# Altium footprint library ADNB95C.PcbLib: 249 footprints (part 11 of 16)
Each footprint in its own frame and in the unit in brackets; x right, y up, seen from the top. Pads: shape width x height; smd on the part's side, far side on the other; paste and mask are expansions set on the pad; w line width, h text height; cw(c..) or ccw(c..) is an arc to the next point about the centre after c.
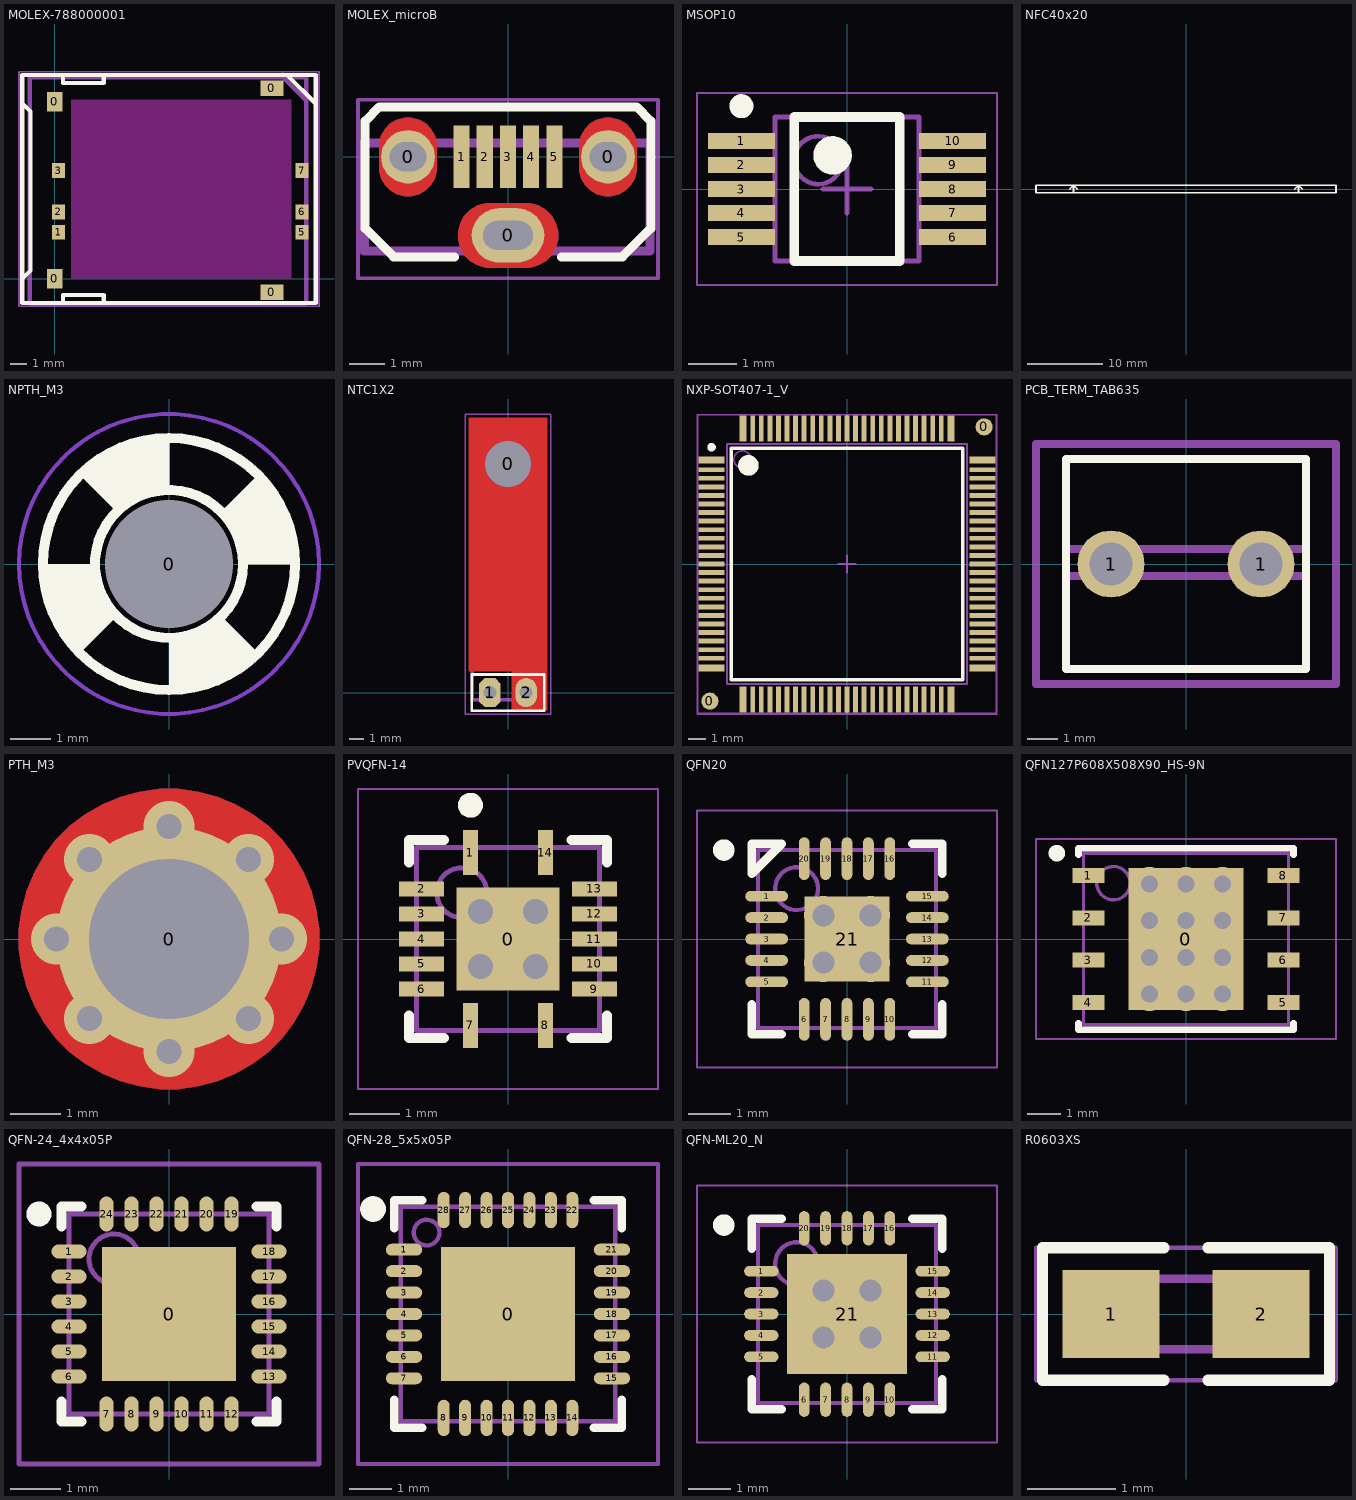
[diagram p10: the footprints below, top view; thin cyan lines are the x and y axes]

## MOLEX-788000001 [mm]
pads (10):
  rect 0.95x1.2 smd: 0(0,0) 0(0,10.85)
  rect 1.4x0.95 smd: 0(13.31,-0.84) 0(13.31,11.68)
  rect 0.8x0.9 smd: 1(0.23,2.85) 2(0.23,4.09) 3(0.23,6.63) 5(15.17,2.85) 6(15.17,4.09) 7(15.17,6.63)
Top Layer keep-out:
  rectangle: 1,0 14.5,11
Top Overlay:
  lines w0.254: -2,0 -1.5,0.5 -1.5,10.25 -2,10.75 ; 0.5,-1.5 0.5,-1 3,-1 3,-1.5 ; 0.5,12.5 0.5,12 3,12 3,12.5 ; 14.25,12.5 16,10.75 ; -2,-1.5 -2,12.5 16,12.5 16,-1.5 -2,-1.5
Top Designator (Mech7):
  text ".Designator" at -0.118,4.992 h1.52
Top Assembly:
  lines w0.254: 14,12.345 15.42,10.925 ; -1.54,-1.505 -1.54,12.345 15.42,12.345 15.42,-1.505 -1.54,-1.505
Top Courtyard:
  lines w0.1: 13.9,12.7 16.2,10.4 ; -2.2,-1.7 16.2,-1.7 16.2,12.7 -2.2,12.7 -2.2,-1.7 ; 16.2,11 16.2,11
3D body "788000001.stp": height 1.51, standoff 0.01, extent -1.54,-1.505 15.42,12.345

## MOLEX_microB [mm] "Molex microB USB P/N: 1051330001"
height 7
pads (8):
  round 1.5 hole 0.813 slot 1.016 at 0 deg: 0(-2.8,0) 0(2.8,0)
  oval 2.032x1.524 hole 0.813 slot 1.4 at 0 deg: 0(0,-2.2)
  rect 0.45x1.75 smd mask+0.076: 1(-1.3,0) 2(-0.65,0) 3(0,0) 4(0.65,0) 5(1.3,0)
Top Layer:
  region: 2,-0.3 2,-0.405 2.055,-0.609 2.16,-0.791 2.309,-0.94 2.491,-1.045 2.695,-1.1 2.905,-1.1 3.109,-1.045 3.291,-0.94 3.44,-0.791 3.545,-0.609 3.6,-0.405 3.6,-0.3 3.6,0.3 3.6,0.405 3.545,0.609 3.44,0.791 3.291,0.94 3.109,1.045 2.905,1.1 2.695,1.1 2.491,1.045 2.309,0.94 2.16,0.791 2.055,0.609 2,0.405 2,0.3
  region: -0.5,-3.1 -0.618,-3.1 -0.847,-3.039 -1.053,-2.92 -1.22,-2.753 -1.339,-2.547 -1.4,-2.318 -1.4,-2.082 -1.339,-1.853 -1.22,-1.647 -1.053,-1.48 -0.847,-1.361 -0.618,-1.3 -0.5,-1.3 0.5,-1.3 0.618,-1.3 0.847,-1.361 1.053,-1.48 1.22,-1.647 1.339,-1.853 1.4,-2.082 1.4,-2.318 1.339,-2.547 1.22,-2.753 1.053,-2.92 0.847,-3.039 0.618,-3.1 0.5,-3.1
  region: -3.6,-0.3 -3.6,-0.405 -3.545,-0.609 -3.44,-0.791 -3.291,-0.94 -3.109,-1.045 -2.905,-1.1 -2.695,-1.1 -2.491,-1.045 -2.309,-0.94 -2.16,-0.791 -2.055,-0.609 -2,-0.405 -2,-0.3 -2,0.3 -2,0.405 -2.055,0.609 -2.16,0.791 -2.309,0.94 -2.491,1.045 -2.695,1.1 -2.905,1.1 -3.109,1.045 -3.291,0.94 -3.44,0.791 -3.545,0.609 -3.6,0.405 -3.6,0.3
Bottom Layer:
  region: 3.6,-0.3 3.6,-0.405 3.545,-0.609 3.44,-0.791 3.291,-0.94 3.109,-1.045 2.905,-1.1 2.695,-1.1 2.491,-1.045 2.309,-0.94 2.16,-0.791 2.055,-0.609 2,-0.405 2,-0.3 2,0.3 2,0.405 2.055,0.609 2.16,0.791 2.309,0.94 2.491,1.045 2.695,1.1 2.905,1.1 3.109,1.045 3.291,0.94 3.44,0.791 3.545,0.609 3.6,0.405 3.6,0.3
  region: 0.5,-3.1 0.618,-3.1 0.847,-3.039 1.053,-2.92 1.22,-2.753 1.339,-2.547 1.4,-2.318 1.4,-2.082 1.339,-1.853 1.22,-1.647 1.053,-1.48 0.847,-1.361 0.618,-1.3 0.5,-1.3 -0.5,-1.3 -0.618,-1.3 -0.847,-1.361 -1.053,-1.48 -1.22,-1.647 -1.339,-1.853 -1.4,-2.082 -1.4,-2.318 -1.339,-2.547 -1.22,-2.753 -1.053,-2.92 -0.847,-3.039 -0.618,-3.1 -0.5,-3.1
  region: -2,-0.3 -2,-0.405 -2.055,-0.609 -2.16,-0.791 -2.309,-0.94 -2.491,-1.045 -2.695,-1.1 -2.905,-1.1 -3.109,-1.045 -3.291,-0.94 -3.44,-0.791 -3.545,-0.609 -3.6,-0.405 -3.6,-0.3 -3.6,0.3 -3.6,0.405 -3.545,0.609 -3.44,0.791 -3.291,0.94 -3.109,1.045 -2.905,1.1 -2.695,1.1 -2.491,1.045 -2.309,0.94 -2.16,0.791 -2.055,0.609 -2,0.405 -2,0.3
Top Overlay:
  lines w0.254: -1.5,-2.8 -3.2,-2.8 -4,-2 -4,1 -3.6,1.4 3.6,1.4 4,1 4,-2 3.2,-2.8 1.5,-2.8
Top Designator (Mech7):
  text ".Designator" at -7.618,-1.508 h1.52
Top Assembly:
  lines w0.254: -4.025,-2.632 3.975,-2.632 3.975,0.383 -4.025,0.383 -4.025,-2.632
Top Courtyard:
  lines w0.1: -4.2,-3.4 4.2,-3.4 4.2,1.6 -4.2,1.6 -4.2,-3.4
3D body "User Library-Micro USB B 1051330011.SLDPRT": height 6.69, standoff -2.32, extent -4.025,-2.632 3.975,0.383

## MSOP10 [mm] "TSSOP, 10-Leads, Body 3.00x3.00mm, Pitch 0.50mm, IPC Medium Density"
height 1.1
pads (10):
  rect 1.4x0.33 smd: 1(-2.2,1) 2(-2.2,0.5) 3(-2.2,0) 4(-2.2,-0.5) 5(-2.2,-1) 6(2.2,-1) 7(2.2,-0.5) 8(2.2,0) 9(2.2,0.5) 10(2.2,1)
Top Overlay:
  circle w0.4: c-0.3,0.7 r0.2
  circle w0.25: c-2.2,1.725 r0.125
  lines w0.2: -1.1,-1.5 1.1,-1.5 1.1,1.5 -1.1,1.5 -1.1,-1.5
Top Designator (Mech7):
  text ".Designator" at -7.618,-0.408 h1.52
Top Assembly:
  circle w0.1: c-0.6,0.6 r0.5
  lines w0.1: -1.5,-1.5 1.5,-1.5 1.5,1.5 -1.5,1.5 -1.5,-1.5
Top Courtyard:
  lines w0.05: -3.125,-2 3.125,-2 3.125,2 -3.125,2 -3.125,-2
  lines w0.1: -0.5,0 0.5,0 ; 0,-0.5 0,0.5
3D body "MSOP10.step": height 1.1, standoff 0, extent -2.45,-1.5 2.45,1.5

## NFC40x20 [mm] "NFC PCB size 40mmx20mmx0.8mm"
height 21
Top Overlay:
  lines w0.203: -15.5,0 -15,0.5 ; -15,-0.5 -15,0.5 ; -14.5,0 -15,0.5 ; 14.5,0 15,0.5 ; 15,-0.5 15,0.5 ; 15.5,0 15,0.5 ; -20,-0.5 -20,0.5 20,0.5 20,-0.5 -20,-0.5
Top Designator (Mech7):
  text ".Designator" at -7.618,-0.508 h1.52
3D body "NFC40x20.SLDPRT": height 21.01, standoff 0.01, extent -20,-0.435 20,0.435

## NPTH_M3 [mm] "Mounting Hole M3  hole 3.2mm Dia 6 mm"
pads (1):
  round 3.1 hole 3.2 unplated: 0(0,0)
Top Layer keep-out:
  circle w0.1: c0,0 r3.75
Bottom Layer keep-out:
  circle w0.1: c0,0 r3.75
Top Overlay:
  circle w0.254: c0,0 r3.15
  circle w0.254: c0,0 r1.85
  region: 1.75,0 1.742,0.172 1.675,0.508 1.543,0.825 1.353,1.11 1.237,1.237 2.298,2.298 2.411,2.185 2.614,1.938 2.791,1.673 2.942,1.391 3.064,1.096 3.156,0.791 3.219,0.477 3.25,0.16 3.25,0
  region: 0,1.75 -0.172,1.742 -0.508,1.675 -0.825,1.543 -1.11,1.353 -1.237,1.237 -2.298,2.298 -2.185,2.411 -1.938,2.614 -1.673,2.791 -1.391,2.942 -1.096,3.064 -0.791,3.156 -0.477,3.219 -0.16,3.25 0,3.25
  region: -1.75,0 -1.742,-0.172 -1.675,-0.508 -1.543,-0.825 -1.353,-1.11 -1.237,-1.237 -2.298,-2.298 -2.411,-2.185 -2.614,-1.938 -2.791,-1.673 -2.942,-1.391 -3.064,-1.096 -3.156,-0.791 -3.219,-0.477 -3.25,-0.16 -3.25,0
  region: 0,-1.75 0.172,-1.742 0.508,-1.675 0.825,-1.543 1.11,-1.353 1.237,-1.237 2.298,-2.298 2.185,-2.411 1.938,-2.614 1.673,-2.791 1.391,-2.942 1.096,-3.064 0.791,-3.156 0.477,-3.219 0.16,-3.25 0,-3.25
Bottom Overlay:
  circle w0.254: c0,0 r3.15
  circle w0.254: c0,0 r1.85
  region: -1.75,0 -1.742,0.172 -1.675,0.508 -1.543,0.825 -1.353,1.11 -1.237,1.237 -2.298,2.298 -2.411,2.185 -2.614,1.938 -2.791,1.673 -2.942,1.391 -3.064,1.096 -3.156,0.791 -3.219,0.477 -3.25,0.16 -3.25,0
  region: 0,1.75 0.172,1.742 0.508,1.675 0.825,1.543 1.11,1.353 1.237,1.237 2.298,2.298 2.185,2.411 1.938,2.614 1.673,2.791 1.391,2.942 1.096,3.064 0.791,3.156 0.477,3.219 0.16,3.25 0,3.25
  region: 1.75,0 1.742,-0.172 1.675,-0.508 1.543,-0.825 1.353,-1.11 1.237,-1.237 2.298,-2.298 2.411,-2.185 2.614,-1.938 2.791,-1.673 2.942,-1.391 3.064,-1.096 3.156,-0.791 3.219,-0.477 3.25,-0.16 3.25,0
  region: 0,-1.75 -0.172,-1.742 -0.508,-1.675 -0.825,-1.543 -1.11,-1.353 -1.237,-1.237 -2.298,-2.298 -2.185,-2.411 -1.938,-2.614 -1.673,-2.791 -1.391,-2.942 -1.096,-3.064 -0.791,-3.156 -0.477,-3.219 -0.16,-3.25 0,-3.25
Top Designator (Mech7):
  text ".Designator" at -7.618,-0.508 h1.52

## NTC1X2 [mm] "NTC Connector; Header; 1x2 Position"
height 18
pads (3):
  round 3.1 hole 3.2: 0(0,16)
  oct 1.5x2.032 hole 0.9: 1(-1.27,0)
  oval 1.5x2.032 hole 0.9: 2(1.27,0)
Top Layer:
  pour cut-out: -2.75,19.25 2.75,19.25 2.75,-1.25 0.25,-1.25 0.25,1.5 -2.75,1.5
Top Overlay:
  lines w0.2: -2.54,-1.27 2.54,-1.27 2.54,1.27 -2.54,1.27 -2.54,-1.27
Top Designator (Mech7):
  text ".Designator" at -7.618,8.492 h1.52
Top Assembly:
  lines w0.254: -2.5,-0.5 -2.5,19 2.5,19 2.5,-0.5 -2.5,-0.5
Top Courtyard:
  lines w0.1: -3,-1.5 -3,19.5 3,19.5 3,-1.5 -3,-1.5
3D body "NTC10k.STEP": height 3.5, standoff -2.5, extent -2.096,-0.25 2.1,18.993

## NXP-SOT407-1_V [mm] "QFP, 100-Leads, Body 14x14mm"
height 1.6
pads (102):
  round 1 smd paste-10 mask+0.5: 0(-8,-8) 0(8,8)
  rect 1.5x0.4 smd: 1(-7.9,6.06) 25(-7.9,-6.06) 51(7.9,-6.06) 75(7.9,6.06)
  rect 1.5x0.28 smd: 2(-7.9,5.5) 3(-7.9,5) 4(-7.9,4.5) 5(-7.9,4) 6(-7.9,3.5) 7(-7.9,3) 8(-7.9,2.5) 9(-7.9,2) 10(-7.9,1.5) 11(-7.9,1) 12(-7.9,0.5) 13(-7.9,0) 14(-7.9,-0.5) 15(-7.9,-1) 16(-7.9,-1.5) 17(-7.9,-2) 18(-7.9,-2.5) 19(-7.9,-3) 20(-7.9,-3.5) 21(-7.9,-4) 22(-7.9,-4.5) 23(-7.9,-5) 24(-7.9,-5.5) 52(7.9,-5.5) 53(7.9,-5) 54(7.9,-4.5) 55(7.9,-4) 56(7.9,-3.5) 57(7.9,-3) 58(7.9,-2.5) 59(7.9,-2) 60(7.9,-1.5) 61(7.9,-1) 62(7.9,-0.5) 63(7.9,0) 64(7.9,0.5) 65(7.9,1) 66(7.9,1.5) 67(7.9,2) 68(7.9,2.5) 69(7.9,3) 70(7.9,3.5) 71(7.9,4) 72(7.9,4.5) 73(7.9,5) 74(7.9,5.5)
  rect 0.4x1.5 smd: 26(-6.06,-7.9) 50(6.06,-7.9) 76(6.06,7.9) 100(-6.06,7.9)
  rect 0.28x1.5 smd: 27(-5.5,-7.9) 28(-5,-7.9) 29(-4.5,-7.9) 30(-4,-7.9) 31(-3.5,-7.9) 32(-3,-7.9) 33(-2.5,-7.9) 34(-2,-7.9) 35(-1.5,-7.9) 36(-1,-7.9) 37(-0.5,-7.9) 38(0,-7.9) 39(0.5,-7.9) 40(1,-7.9) 41(1.5,-7.9) 42(2,-7.9) 43(2.5,-7.9) 44(3,-7.9) 45(3.5,-7.9) 46(4,-7.9) 47(4.5,-7.9) 48(5,-7.9) 49(5.5,-7.9) 77(5.5,7.9) 78(5,7.9) 79(4.5,7.9) 80(4,7.9) 81(3.5,7.9) 82(3,7.9) 83(2.5,7.9) 84(2,7.9) 85(1.5,7.9) 86(1,7.9) 87(0.5,7.9) 88(0,7.9) 89(-0.5,7.9) 90(-1,7.9) 91(-1.5,7.9) 92(-2,7.9) 93(-2.5,7.9) 94(-3,7.9) 95(-3.5,7.9) 96(-4,7.9) 97(-4.5,7.9) 98(-5,7.9) 99(-5.5,7.9)
Top Overlay:
  circle w0.6: c-5.75,5.75 r0.3
  circle w0.25: c-7.9,6.81 r0.125
  lines w0.2: -6.75,-6.75 6.75,-6.75 6.75,6.75 -6.75,6.75 -6.75,-6.75
Top Designator (Mech7):
  text ".Designator" at -7.617,-0.508 h1.52
Top Assembly:
  circle w0.1: c-6.1,6.1 r0.5
  lines w0.1: -7,-7 7,-7 7,7 -7,7 -7,-7
Top Courtyard:
  lines w0.05: -8.75,-8.75 8.75,-8.75 8.75,8.75 -8.75,8.75 -8.75,-8.75
  lines w0.1: -0.5,0 0.5,0 ; 0,-0.5 0,0.5 ; -8.7,-8.7 8.7,-8.7 8.7,8.7 -8.7,8.7 -8.7,-8.7
3D body "User Library-LQFP100_Grid_0_5.STEP": height 1.6, standoff 0, extent -8,-8 8,8

## PCB_TERM_TAB635 [mil]
pads (2):
  round 88 hole 56: 1(-98.43,0) 1(98.43,0)
Top Overlay:
  lines w10: -157.48,-137.8 -157.48,137.8 157.48,137.8 157.48,-137.8 -157.48,-137.8
Top Designator (Mech7):
  text ".Designator" at -299.9,-16.72 h60
Top Assembly:
  lines w10: -157.48,19.68 -157.48,19.68 ; -157.48,19.68 -157.48,-15.74 157.49,-15.74 ; -157.48,19.68 157.48,19.68 157.48,-15.73 ; 157.48,-15.73 157.49,-15.74
Top Courtyard:
  lines w10: -196.85,-157.48 -196.85,157.48 196.85,157.48 196.85,-157.48 -196.85,-157.48
3D body "pcb_term_tab635.SLDPRT": height 394.2, standoff -156.98, extent -157.48,-15.74 157.48,15.75

## PTH_M3 [mm] "Mounting Hole M3  hole 3.2mm Dia 6 mm"
pads (1):
  round 4.5 hole 3.2: 0(0,0)
via 1.591,-1.591 diameter 1.016 hole 0.508
via 0,-2.25 diameter 1.016 hole 0.508
via -1.591,-1.591 diameter 1.016 hole 0.508
via -2.25,0 diameter 1.016 hole 0.508
via -1.591,1.591 diameter 1.016 hole 0.508
via 0,2.25 diameter 1.016 hole 0.508
via 1.591,1.591 diameter 1.016 hole 0.508
via 2.25,0 diameter 1.016 hole 0.508
Top Layer:
  region: 0,-3 -0.197,-3 -0.587,-2.949 -0.966,-2.847 -1.33,-2.696 -1.67,-2.5 -1.982,-2.26 -2.26,-1.982 -2.5,-1.67 -2.696,-1.33 -2.847,-0.966 -2.949,-0.587 -3,-0.197 -3,0 -3,0.197 -2.949,0.587 -2.847,0.966 -2.696,1.33 -2.5,1.67 -2.26,1.982 -1.982,2.26 -1.67,2.5 -1.33,2.696 -0.966,2.847 -0.587,2.949 -0.197,3 0,3 0.197,3 0.587,2.949 0.966,2.847 1.33,2.696 1.67,2.5 1.982,2.26 2.26,1.982 2.5,1.67 2.696,1.33 2.847,0.966 2.949,0.587 3,0.197 3,0 3,-0.197 2.949,-0.587 2.847,-0.966 2.696,-1.33 2.5,-1.67 2.26,-1.982 1.982,-2.26 1.67,-2.5 1.33,-2.696 0.966,-2.847 0.587,-2.949 0.197,-3
Bottom Layer:
  region: 0,-3 0.197,-3 0.587,-2.949 0.966,-2.847 1.33,-2.696 1.67,-2.5 1.982,-2.26 2.26,-1.982 2.5,-1.67 2.696,-1.33 2.847,-0.966 2.949,-0.587 3,-0.197 3,0 3,0.197 2.949,0.587 2.847,0.966 2.696,1.33 2.5,1.67 2.26,1.982 1.982,2.26 1.67,2.5 1.33,2.696 0.966,2.847 0.587,2.949 0.197,3 0,3 -0.197,3 -0.587,2.949 -0.966,2.847 -1.33,2.696 -1.67,2.5 -1.982,2.26 -2.26,1.982 -2.5,1.67 -2.696,1.33 -2.847,0.966 -2.949,0.587 -3,0.197 -3,0 -3,-0.197 -2.949,-0.587 -2.847,-0.966 -2.696,-1.33 -2.5,-1.67 -2.26,-1.982 -1.982,-2.26 -1.67,-2.5 -1.33,-2.696 -0.966,-2.847 -0.587,-2.949 -0.197,-3
Top Designator (Mech7):
  text ".Designator" at -7.618,-0.508 h1.52

## PVQFN-14 [mm] "QFN, 14-Leads, Body 3.50x3.50mm, Pitch 1.50mm/0.50mm, Thermal Pad 2.05x2.05mm, IPC Medium Density"
height 1
pads (15):
  rect 2.05x2.05 smd: 0(0,0)
  rect 0.3x0.9 smd: 1(-0.75,1.725) 7(-0.75,-1.725) 8(0.75,-1.725) 14(0.75,1.725)
  rect 0.9x0.3 smd: 2(-1.725,1) 3(-1.725,0.5) 4(-1.725,0) 5(-1.725,-0.5) 6(-1.725,-1) 9(1.725,-1) 10(1.725,-0.5) 11(1.725,0) 12(1.725,0.5) 13(1.725,1)
via -0.55,0.55 diameter 0.9 hole 0.5
via 0.55,0.55 diameter 0.9 hole 0.5
via 0.55,-0.55 diameter 0.9 hole 0.5
via -0.55,-0.55 diameter 0.9 hole 0.5
Top Overlay:
  circle w0.25: c-0.75,2.675 r0.125
  lines w0.2: -1.975,-1.525 -1.975,-1.975 -1.275,-1.975 ; -1.975,1.525 -1.975,1.975 -1.275,1.975 ; 1.275,-1.975 1.975,-1.975 1.975,-1.525 ; 1.275,1.975 1.975,1.975 1.975,1.525
Top Designator (Mech7):
  text ".Designator" at -7.618,-0.245 h1.52
Top Assembly:
  circle w0.1: c-0.925,0.925 r0.5
  lines w0.1: -1.825,-1.825 -1.825,1.825 1.825,1.825 1.825,-1.825 -1.825,-1.825
Top Courtyard:
  lines w0.05: -3,-3 -3,3 3,3 3,-3 -3,-3
  lines w0.1: -0.5,0 0.5,0 ; 0,-0.5 0,0.5
3D body: height 1, standoff 0.08, extent -1.825,-1.825 1.825,1.825

## QFN20 [mm] "QFN, 20-Leads, Body 4.00x4.00mm, Pitch 0.50mm, Thermal Pad 1.98x1.98mm, IPC Medium Density"
height 0.8
pads (21):
  oval 1x0.25 smd mask+0.076: 1(-1.875,1) 2(-1.875,0.5) 3(-1.875,0) 4(-1.875,-0.5) 5(-1.875,-1) 11(1.875,-1) 12(1.875,-0.5) 13(1.875,0) 14(1.875,0.5) 15(1.875,1)
  oval 0.25x1 smd mask+0.076: 6(-1,-1.875) 7(-0.5,-1.875) 8(0,-1.875) 9(0.5,-1.875) 10(1,-1.875) 16(1,1.875) 17(0.5,1.875) 18(0,1.875) 19(-0.5,1.875) 20(-1,1.875)
  rect 1.98x1.98 smd: 21(0,0)
via 0.55,0.55 diameter 0.9 hole 0.508
via 0.55,-0.55 diameter 0.9 hole 0.508
via -0.55,-0.55 diameter 0.9 hole 0.508
via -0.55,0.55 diameter 0.9 hole 0.508
Top Overlay:
  circle w0.25: c-2.875,2.075 r0.125
  lines w0.2: -2.225,-1.525 -2.225,-2.225 -1.525,-2.225 ; -2.225,1.525 -2.225,2.225 -1.525,2.225 ; 1.525,-2.225 2.225,-2.225 2.225,-1.525 ; 1.525,2.225 2.225,2.225 2.225,1.525
  lines w0.203: -2.225,1.525 -1.525,2.225
Top Designator (Mech7):
  text ".Designator" at -7.855,-0.508 h1.52
Top Assembly:
  circle w0.1: c-1.175,1.175 r0.5
  lines w0.1: -2.075,-2.075 2.075,-2.075 2.075,2.075 -2.075,2.075 -2.075,-2.075
Top Courtyard:
  lines w0.05: -3.5,-3 3.5,-3 3.5,3 -3.5,3 -3.5,-3
3D body "QFN20.step": height 0.8, standoff 0, extent -2.085,-2.085 2.085,2.085

## QFN127P608X508X90_HS-9N [mm] "QFN, 8-Leads, Body 6.08x5.08mm, Pitch 1.27mm, Thermal Pad 3.45x4.25mm, IPC Medium Density"
height 0.9
pads (17):
  rect 3.45x4.25 smd: 0(0,0)
  rect 0.95x0.45 smd: 1(-2.925,1.905) 2(-2.925,0.635) 3(-2.925,-0.635) 4(-2.925,-1.905) 5(2.925,-1.905) 6(2.925,-0.635) 7(2.925,0.635) 8(2.925,1.905)
  rect 0x0 smd: 9(-0.85,0) 10(-0.35,0) 11(0,0.85) 12(0,0.35) 13(0.85,0) 14(0.35,0) 15(0,-0.85) 16(0,-0.35)
via -1.1,1.65 diameter 1.016 hole 0.508
via 0,1.65 diameter 1.016 hole 0.508
via 1.1,1.65 diameter 1.016 hole 0.508
via -1.1,0.55 diameter 1.016 hole 0.508
via 0,0.55 diameter 1.016 hole 0.508
via 1.1,0.55 diameter 1.016 hole 0.508
via -1.1,-0.55 diameter 1.016 hole 0.508
via 0,-0.55 diameter 1.016 hole 0.508
via 1.1,-0.55 diameter 1.016 hole 0.508
via -1.1,-1.65 diameter 1.016 hole 0.508
via 0,-1.65 diameter 1.016 hole 0.508
via 1.1,-1.65 diameter 1.016 hole 0.508
Top Overlay:
  circle w0.25: c-3.875,2.575 r0.125
  lines w0.2: -3.225,-2.53 -3.225,-2.725 0.01,-2.725 ; -3.225,2.53 -3.225,2.725 0.01,2.725 ; -0.01,-2.725 3.225,-2.725 3.225,-2.53 ; -0.01,2.725 3.225,2.725 3.225,2.53
Top Designator (Mech7):
  text ".Designator" at -7.843,-0.508 h1.52
Top Assembly:
  circle w0.1: c-2.175,1.675 r0.5
  lines w0.1: -3.075,-2.575 -3.075,2.575 3.075,2.575 3.075,-2.575 -3.075,-2.575
Top Courtyard:
  lines w0.05: -4.5,-3 -4.5,3 4.5,3 4.5,-3 -4.5,-3
  lines w0.1: -0.5,0 0.5,0 ; 0,-0.5 0,0.5

## QFN-24_4x4x05P [mm]
pads (25):
  rect 2.68x2.68 smd mask+0.051: 0(0,0)
  oval 0.7x0.28 smd mask+0.051: 1(-2,1.25) 2(-2,0.75) 3(-2,0.25) 4(-2,-0.25) 5(-2,-0.75) 6(-2,-1.25) 13(2,-1.25) 14(2,-0.75) 15(2,-0.25) 16(2,0.25) 17(2,0.75) 18(2,1.25)
  oval 0.28x0.7 smd mask+0.051: 7(-1.25,-2) 8(-0.75,-2) 9(-0.25,-2) 10(0.25,-2) 11(0.75,-2) 12(1.25,-2) 19(1.25,2) 20(0.75,2) 21(0.25,2) 22(-0.25,2) 23(-0.75,2) 24(-1.25,2)
Top Overlay:
  circle w0.25: c-2.6,2 r0.125
  lines w0.2: -2.15,-1.75 -2.15,-2.15 -1.75,-2.15 ; -2.15,1.75 -2.15,2.15 -1.75,2.15 ; 1.75,-2.15 2.15,-2.15 2.15,-1.75 ; 1.75,2.15 2.15,2.15 2.15,1.75
Top Designator (Mech7):
  text ".Designator" at -7.618,-0.508 h1.52
Top Assembly:
  circle w0.1: c-1.1,1.1 r0.5
  lines w0.1: -2,-2 -2,2 2,2 2,-2 -2,-2
Top Courtyard:
  lines w0.1: -0.5,0 0.5,0 ; 0,-0.5 0,0.5 ; -3,-3 3,-3 3,3 -3,3 -3,-3
3D body "User Library-QFN 24 4x4.STEP": height 0.91, standoff 0.01, extent -2.002,-2.002 2.002,2.002

## QFN-28_5x5x05P [mm]
pads (29):
  rect 3.13x3.13 smd mask+0.051: 0(0,0)
  oval 0.85x0.28 smd mask+0.051: 1(-2.425,1.5) 2(-2.425,1) 3(-2.425,0.5) 4(-2.425,0) 5(-2.425,-0.5) 6(-2.425,-1) 7(-2.425,-1.5) 15(2.425,-1.5) 16(2.425,-1) 17(2.425,-0.5) 18(2.425,0) 19(2.425,0.5) 20(2.425,1) 21(2.425,1.5)
  oval 0.28x0.85 smd mask+0.051: 8(-1.5,-2.425) 9(-1,-2.425) 10(-0.5,-2.425) 11(0,-2.425) 12(0.5,-2.425) 13(1,-2.425) 14(1.5,-2.425) 22(1.5,2.425) 23(1,2.425) 24(0.5,2.425) 25(0,2.425) 26(-0.5,2.425) 27(-1,2.425) 28(-1.5,2.425)
Top Overlay:
  circle w0.3: c-3.15,2.45 r0.15
  lines w0.2: -2.65,-2 -2.65,-2.65 -2,-2.65 ; -2.65,2 -2.65,2.65 -2,2.65 ; 2,-2.65 2.65,-2.65 2.65,-2 ; 2,2.65 2.65,2.65 2.65,2
Top Designator (Mech7):
  text ".Designator" at -7.618,-0.508 h1.52
Top Assembly:
  circle w0.1: c-1.9,1.9 r0.3
  lines w0.1: -2.5,-2.5 2.5,-2.5 2.5,2.5 -2.5,2.5 -2.5,-2.5
Top Courtyard:
  lines w0.1: -0.5,0 0.5,0 ; 0,-0.5 0,0.5 ; -3.5,-3.5 -3.5,3.5 3.5,3.5 3.5,-3.5 -3.5,-3.5
3D body "User Library-QFN28__5.STEP": height 0.91, standoff 0.01, extent -2.5,-2.5 2.5,2.5

## QFN-ML20_N [mm] "QFN, 20-Leads, Body 4x4mm, Pitch 0.5mm, Thermal Pad 2.8x2.8mm, IPC Medium Density"
height 1
pads (21):
  oval 0.8x0.25 smd: 1(-2,1) 2(-2,0.5) 3(-2,0) 4(-2,-0.5) 5(-2,-1) 11(2,-1) 12(2,-0.5) 13(2,0) 14(2,0.5) 15(2,1)
  oval 0.25x0.8 smd: 6(-1,-2) 7(-0.5,-2) 8(0,-2) 9(0.5,-2) 10(1,-2) 16(1,2) 17(0.5,2) 18(0,2) 19(-0.5,2) 20(-1,2)
  rect 2.8x2.8 smd: 21(0,0)
via 0.55,-0.55 diameter 1.016 hole 0.508
via -0.55,-0.55 diameter 1.016 hole 0.508
via 0.55,0.55 diameter 1.016 hole 0.508
via -0.55,0.55 diameter 1.016 hole 0.508
Top Overlay:
  circle w0.25: c-2.875,2.075 r0.125
  lines w0.2: -2.225,-1.525 -2.225,-2.225 -1.525,-2.225 ; -2.225,1.525 -2.225,2.225 -1.525,2.225 ; 1.525,-2.225 2.225,-2.225 2.225,-1.525 ; 1.525,2.225 2.225,2.225 2.225,1.525
Top Designator (Mech7):
  text ".Designator" at -7.843,-0.508 h1.52
Top Assembly:
  circle w0.1: c-1.175,1.175 r0.5
  lines w0.1: -2.075,-2.075 2.075,-2.075 2.075,2.075 -2.075,2.075 -2.075,-2.075
Top Courtyard:
  lines w0.05: -3.5,-3 3.5,-3 3.5,3 -3.5,3 -3.5,-3
  lines w0.1: -0.5,0 0.5,0 ; 0,-0.5 0,0.5
3D body: height 1, standoff 0, extent -2.075,-2.075 2.075,2.075

## R0603XS [mm] "Chip Resistor; Body 1.6 x 0.8 mm (LxW typ)"
height 0.6
pads (2):
  rect 1.1x1 smd: 1(-0.85,0) 2(0.85,0)
Top Overlay:
  lines w0.127: -0.25,-0.75 -1.625,-0.75 -1.625,0.75 -0.25,0.75 ; 0.25,-0.75 1.625,-0.75 1.625,0.75 0.25,0.75
Top Designator (Mech7):
  text ".Designator" at -3.809,-0.254 h0.76
Top Assembly:
  lines w0.1: -0.85,-0.4 -0.85,0.4 0.85,0.4 0.85,-0.4 -0.85,-0.4
Top Courtyard:
  lines w0.05: -1.7,-0.75 -1.7,0.75 1.7,0.75 1.7,-0.75 -1.7,-0.75
3D body "User Library-RES_1609-0603.STEP": height 0.56, standoff 0, extent -0.85,-0.4 0.85,0.4